# Altium schematic symbol library Connector.SchLib: 394 symbols (part 2 of 4) (continued)
## Conn_01x55_Pin
designator *  value Conn_01x55_Pin  Reference: J
"Generic connector, single row, 01x55, script generated"; ki_fp_filters: Connector*:*_1x??_*; Datasheet: ~; Description_: "Generic connector, single row, 01x55, script generated"; ki_keywords: connector
pins: 1 Pin_1, 2 Pin_2, 3 Pin_3, 4 Pin_4, 5 Pin_5, 6 Pin_6, 7 Pin_7, 8 Pin_8, 9 Pin_9, 10 Pin_10, 11 Pin_11, 12 Pin_12, 13 Pin_13, 14 Pin_14, 15 Pin_15, 16 Pin_16, 17 Pin_17, 18 Pin_18, 19 Pin_19, 20 Pin_20, 21 Pin_21, 22 Pin_22, 23 Pin_23, 24 Pin_24, 25 Pin_25, 26 Pin_26, 27 Pin_27, 28 Pin_28, 29 Pin_29, 30 Pin_30, 31 Pin_31, 32 Pin_32, 33 Pin_33, 34 Pin_34, 35 Pin_35, 36 Pin_36, 37 Pin_37, 38 Pin_38, 39 Pin_39, 40 Pin_40, 41 Pin_41, 42 Pin_42, 43 Pin_43, 44 Pin_44, 45 Pin_45, 46 Pin_46, 47 Pin_47, 48 Pin_48, 49 Pin_49, 50 Pin_50, 51 Pin_51, 52 Pin_52, 53 Pin_53, 54 Pin_54, 55 Pin_55

## Conn_01x55_Socket
designator *  value Conn_01x55_Socket  Reference: J
"Generic connector, single row, 01x55, script generated"; ki_fp_filters: Connector*:*_1x??_*; Datasheet: ~; Description_: "Generic connector, single row, 01x55, script generated"; ki_keywords: connector
pins: 1 Pin_1, 2 Pin_2, 3 Pin_3, 4 Pin_4, 5 Pin_5, 6 Pin_6, 7 Pin_7, 8 Pin_8, 9 Pin_9, 10 Pin_10, 11 Pin_11, 12 Pin_12, 13 Pin_13, 14 Pin_14, 15 Pin_15, 16 Pin_16, 17 Pin_17, 18 Pin_18, 19 Pin_19, 20 Pin_20, 21 Pin_21, 22 Pin_22, 23 Pin_23, 24 Pin_24, 25 Pin_25, 26 Pin_26, 27 Pin_27, 28 Pin_28, 29 Pin_29, 30 Pin_30, 31 Pin_31, 32 Pin_32, 33 Pin_33, 34 Pin_34, 35 Pin_35, 36 Pin_36, 37 Pin_37, 38 Pin_38, 39 Pin_39, 40 Pin_40, 41 Pin_41, 42 Pin_42, 43 Pin_43, 44 Pin_44, 45 Pin_45, 46 Pin_46, 47 Pin_47, 48 Pin_48, 49 Pin_49, 50 Pin_50, 51 Pin_51, 52 Pin_52, 53 Pin_53, 54 Pin_54, 55 Pin_55

## Conn_01x56_Pin
designator *  value Conn_01x56_Pin  Reference: J
"Generic connector, single row, 01x56, script generated"; ki_fp_filters: Connector*:*_1x??_*; Datasheet: ~; Description_: "Generic connector, single row, 01x56, script generated"; ki_keywords: connector
pins: 1 Pin_1, 2 Pin_2, 3 Pin_3, 4 Pin_4, 5 Pin_5, 6 Pin_6, 7 Pin_7, 8 Pin_8, 9 Pin_9, 10 Pin_10, 11 Pin_11, 12 Pin_12, 13 Pin_13, 14 Pin_14, 15 Pin_15, 16 Pin_16, 17 Pin_17, 18 Pin_18, 19 Pin_19, 20 Pin_20, 21 Pin_21, 22 Pin_22, 23 Pin_23, 24 Pin_24, 25 Pin_25, 26 Pin_26, 27 Pin_27, 28 Pin_28, 29 Pin_29, 30 Pin_30, 31 Pin_31, 32 Pin_32, 33 Pin_33, 34 Pin_34, 35 Pin_35, 36 Pin_36, 37 Pin_37, 38 Pin_38, 39 Pin_39, 40 Pin_40, 41 Pin_41, 42 Pin_42, 43 Pin_43, 44 Pin_44, 45 Pin_45, 46 Pin_46, 47 Pin_47, 48 Pin_48, 49 Pin_49, 50 Pin_50, 51 Pin_51, 52 Pin_52, 53 Pin_53, 54 Pin_54, 55 Pin_55, 56 Pin_56

## Conn_01x56_Socket
designator *  value Conn_01x56_Socket  Reference: J
"Generic connector, single row, 01x56, script generated"; ki_fp_filters: Connector*:*_1x??_*; Datasheet: ~; Description_: "Generic connector, single row, 01x56, script generated"; ki_keywords: connector
pins: 1 Pin_1, 2 Pin_2, 3 Pin_3, 4 Pin_4, 5 Pin_5, 6 Pin_6, 7 Pin_7, 8 Pin_8, 9 Pin_9, 10 Pin_10, 11 Pin_11, 12 Pin_12, 13 Pin_13, 14 Pin_14, 15 Pin_15, 16 Pin_16, 17 Pin_17, 18 Pin_18, 19 Pin_19, 20 Pin_20, 21 Pin_21, 22 Pin_22, 23 Pin_23, 24 Pin_24, 25 Pin_25, 26 Pin_26, 27 Pin_27, 28 Pin_28, 29 Pin_29, 30 Pin_30, 31 Pin_31, 32 Pin_32, 33 Pin_33, 34 Pin_34, 35 Pin_35, 36 Pin_36, 37 Pin_37, 38 Pin_38, 39 Pin_39, 40 Pin_40, 41 Pin_41, 42 Pin_42, 43 Pin_43, 44 Pin_44, 45 Pin_45, 46 Pin_46, 47 Pin_47, 48 Pin_48, 49 Pin_49, 50 Pin_50, 51 Pin_51, 52 Pin_52, 53 Pin_53, 54 Pin_54, 55 Pin_55, 56 Pin_56

## Conn_01x57_Pin
designator *  value Conn_01x57_Pin  Reference: J
"Generic connector, single row, 01x57, script generated"; ki_fp_filters: Connector*:*_1x??_*; Datasheet: ~; Description_: "Generic connector, single row, 01x57, script generated"; ki_keywords: connector
pins: 1 Pin_1, 2 Pin_2, 3 Pin_3, 4 Pin_4, 5 Pin_5, 6 Pin_6, 7 Pin_7, 8 Pin_8, 9 Pin_9, 10 Pin_10, 11 Pin_11, 12 Pin_12, 13 Pin_13, 14 Pin_14, 15 Pin_15, 16 Pin_16, 17 Pin_17, 18 Pin_18, 19 Pin_19, 20 Pin_20, 21 Pin_21, 22 Pin_22, 23 Pin_23, 24 Pin_24, 25 Pin_25, 26 Pin_26, 27 Pin_27, 28 Pin_28, 29 Pin_29, 30 Pin_30, 31 Pin_31, 32 Pin_32, 33 Pin_33, 34 Pin_34, 35 Pin_35, 36 Pin_36, 37 Pin_37, 38 Pin_38, 39 Pin_39, 40 Pin_40, 41 Pin_41, 42 Pin_42, 43 Pin_43, 44 Pin_44, 45 Pin_45, 46 Pin_46, 47 Pin_47, 48 Pin_48, 49 Pin_49, 50 Pin_50, 51 Pin_51, 52 Pin_52, 53 Pin_53, 54 Pin_54, 55 Pin_55, 56 Pin_56, 57 Pin_57

## Conn_01x57_Socket
designator *  value Conn_01x57_Socket  Reference: J
"Generic connector, single row, 01x57, script generated"; ki_fp_filters: Connector*:*_1x??_*; Datasheet: ~; Description_: "Generic connector, single row, 01x57, script generated"; ki_keywords: connector
pins: 1 Pin_1, 2 Pin_2, 3 Pin_3, 4 Pin_4, 5 Pin_5, 6 Pin_6, 7 Pin_7, 8 Pin_8, 9 Pin_9, 10 Pin_10, 11 Pin_11, 12 Pin_12, 13 Pin_13, 14 Pin_14, 15 Pin_15, 16 Pin_16, 17 Pin_17, 18 Pin_18, 19 Pin_19, 20 Pin_20, 21 Pin_21, 22 Pin_22, 23 Pin_23, 24 Pin_24, 25 Pin_25, 26 Pin_26, 27 Pin_27, 28 Pin_28, 29 Pin_29, 30 Pin_30, 31 Pin_31, 32 Pin_32, 33 Pin_33, 34 Pin_34, 35 Pin_35, 36 Pin_36, 37 Pin_37, 38 Pin_38, 39 Pin_39, 40 Pin_40, 41 Pin_41, 42 Pin_42, 43 Pin_43, 44 Pin_44, 45 Pin_45, 46 Pin_46, 47 Pin_47, 48 Pin_48, 49 Pin_49, 50 Pin_50, 51 Pin_51, 52 Pin_52, 53 Pin_53, 54 Pin_54, 55 Pin_55, 56 Pin_56, 57 Pin_57

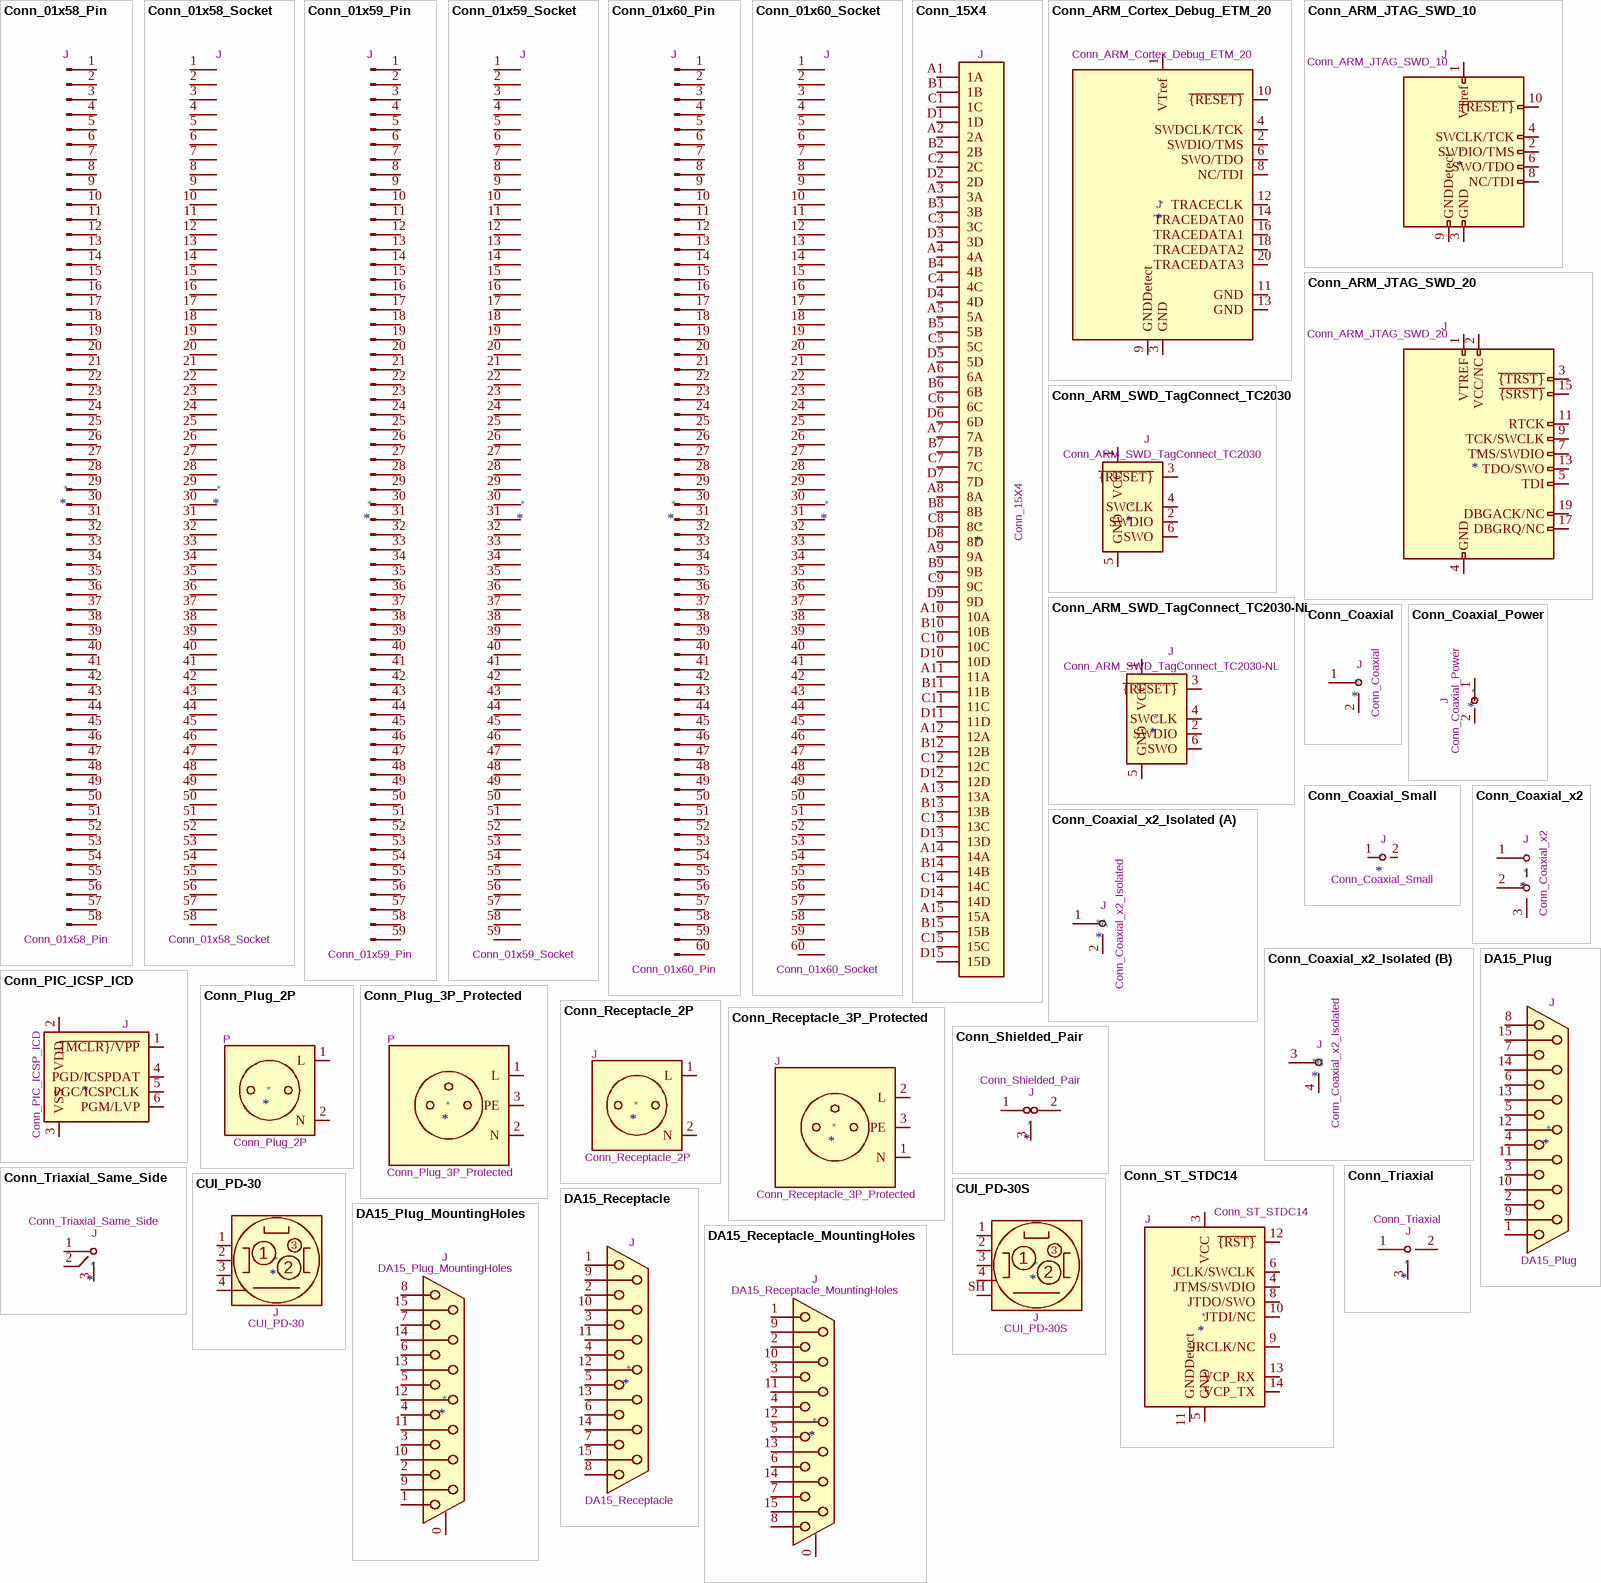
[diagram p8: symbols Conn_01x58_Pin to DA15_Receptacle_MountingHoles]

## Conn_01x58_Pin
designator *  value Conn_01x58_Pin  Reference: J
"Generic connector, single row, 01x58, script generated"; ki_fp_filters: Connector*:*_1x??_*; Datasheet: ~; Description_: "Generic connector, single row, 01x58, script generated"; ki_keywords: connector
pins: 1 Pin_1, 2 Pin_2, 3 Pin_3, 4 Pin_4, 5 Pin_5, 6 Pin_6, 7 Pin_7, 8 Pin_8, 9 Pin_9, 10 Pin_10, 11 Pin_11, 12 Pin_12, 13 Pin_13, 14 Pin_14, 15 Pin_15, 16 Pin_16, 17 Pin_17, 18 Pin_18, 19 Pin_19, 20 Pin_20, 21 Pin_21, 22 Pin_22, 23 Pin_23, 24 Pin_24, 25 Pin_25, 26 Pin_26, 27 Pin_27, 28 Pin_28, 29 Pin_29, 30 Pin_30, 31 Pin_31, 32 Pin_32, 33 Pin_33, 34 Pin_34, 35 Pin_35, 36 Pin_36, 37 Pin_37, 38 Pin_38, 39 Pin_39, 40 Pin_40, 41 Pin_41, 42 Pin_42, 43 Pin_43, 44 Pin_44, 45 Pin_45, 46 Pin_46, 47 Pin_47, 48 Pin_48, 49 Pin_49, 50 Pin_50, 51 Pin_51, 52 Pin_52, 53 Pin_53, 54 Pin_54, 55 Pin_55, 56 Pin_56, 57 Pin_57, 58 Pin_58

## Conn_01x58_Socket
designator *  value Conn_01x58_Socket  Reference: J
"Generic connector, single row, 01x58, script generated"; ki_fp_filters: Connector*:*_1x??_*; Datasheet: ~; Description_: "Generic connector, single row, 01x58, script generated"; ki_keywords: connector
pins: 1 Pin_1, 2 Pin_2, 3 Pin_3, 4 Pin_4, 5 Pin_5, 6 Pin_6, 7 Pin_7, 8 Pin_8, 9 Pin_9, 10 Pin_10, 11 Pin_11, 12 Pin_12, 13 Pin_13, 14 Pin_14, 15 Pin_15, 16 Pin_16, 17 Pin_17, 18 Pin_18, 19 Pin_19, 20 Pin_20, 21 Pin_21, 22 Pin_22, 23 Pin_23, 24 Pin_24, 25 Pin_25, 26 Pin_26, 27 Pin_27, 28 Pin_28, 29 Pin_29, 30 Pin_30, 31 Pin_31, 32 Pin_32, 33 Pin_33, 34 Pin_34, 35 Pin_35, 36 Pin_36, 37 Pin_37, 38 Pin_38, 39 Pin_39, 40 Pin_40, 41 Pin_41, 42 Pin_42, 43 Pin_43, 44 Pin_44, 45 Pin_45, 46 Pin_46, 47 Pin_47, 48 Pin_48, 49 Pin_49, 50 Pin_50, 51 Pin_51, 52 Pin_52, 53 Pin_53, 54 Pin_54, 55 Pin_55, 56 Pin_56, 57 Pin_57, 58 Pin_58

## Conn_01x59_Pin
designator *  value Conn_01x59_Pin  Reference: J
"Generic connector, single row, 01x59, script generated"; ki_fp_filters: Connector*:*_1x??_*; Datasheet: ~; Description_: "Generic connector, single row, 01x59, script generated"; ki_keywords: connector
pins: 1 Pin_1, 2 Pin_2, 3 Pin_3, 4 Pin_4, 5 Pin_5, 6 Pin_6, 7 Pin_7, 8 Pin_8, 9 Pin_9, 10 Pin_10, 11 Pin_11, 12 Pin_12, 13 Pin_13, 14 Pin_14, 15 Pin_15, 16 Pin_16, 17 Pin_17, 18 Pin_18, 19 Pin_19, 20 Pin_20, 21 Pin_21, 22 Pin_22, 23 Pin_23, 24 Pin_24, 25 Pin_25, 26 Pin_26, 27 Pin_27, 28 Pin_28, 29 Pin_29, 30 Pin_30, 31 Pin_31, 32 Pin_32, 33 Pin_33, 34 Pin_34, 35 Pin_35, 36 Pin_36, 37 Pin_37, 38 Pin_38, 39 Pin_39, 40 Pin_40, 41 Pin_41, 42 Pin_42, 43 Pin_43, 44 Pin_44, 45 Pin_45, 46 Pin_46, 47 Pin_47, 48 Pin_48, 49 Pin_49, 50 Pin_50, 51 Pin_51, 52 Pin_52, 53 Pin_53, 54 Pin_54, 55 Pin_55, 56 Pin_56, 57 Pin_57, 58 Pin_58, 59 Pin_59

## Conn_01x59_Socket
designator *  value Conn_01x59_Socket  Reference: J
"Generic connector, single row, 01x59, script generated"; ki_fp_filters: Connector*:*_1x??_*; Datasheet: ~; Description_: "Generic connector, single row, 01x59, script generated"; ki_keywords: connector
pins: 1 Pin_1, 2 Pin_2, 3 Pin_3, 4 Pin_4, 5 Pin_5, 6 Pin_6, 7 Pin_7, 8 Pin_8, 9 Pin_9, 10 Pin_10, 11 Pin_11, 12 Pin_12, 13 Pin_13, 14 Pin_14, 15 Pin_15, 16 Pin_16, 17 Pin_17, 18 Pin_18, 19 Pin_19, 20 Pin_20, 21 Pin_21, 22 Pin_22, 23 Pin_23, 24 Pin_24, 25 Pin_25, 26 Pin_26, 27 Pin_27, 28 Pin_28, 29 Pin_29, 30 Pin_30, 31 Pin_31, 32 Pin_32, 33 Pin_33, 34 Pin_34, 35 Pin_35, 36 Pin_36, 37 Pin_37, 38 Pin_38, 39 Pin_39, 40 Pin_40, 41 Pin_41, 42 Pin_42, 43 Pin_43, 44 Pin_44, 45 Pin_45, 46 Pin_46, 47 Pin_47, 48 Pin_48, 49 Pin_49, 50 Pin_50, 51 Pin_51, 52 Pin_52, 53 Pin_53, 54 Pin_54, 55 Pin_55, 56 Pin_56, 57 Pin_57, 58 Pin_58, 59 Pin_59

## Conn_01x60_Pin
designator *  value Conn_01x60_Pin  Reference: J
"Generic connector, single row, 01x60, script generated"; ki_fp_filters: Connector*:*_1x??_*; Datasheet: ~; Description_: "Generic connector, single row, 01x60, script generated"; ki_keywords: connector
pins: 1 Pin_1, 2 Pin_2, 3 Pin_3, 4 Pin_4, 5 Pin_5, 6 Pin_6, 7 Pin_7, 8 Pin_8, 9 Pin_9, 10 Pin_10, 11 Pin_11, 12 Pin_12, 13 Pin_13, 14 Pin_14, 15 Pin_15, 16 Pin_16, 17 Pin_17, 18 Pin_18, 19 Pin_19, 20 Pin_20, 21 Pin_21, 22 Pin_22, 23 Pin_23, 24 Pin_24, 25 Pin_25, 26 Pin_26, 27 Pin_27, 28 Pin_28, 29 Pin_29, 30 Pin_30, 31 Pin_31, 32 Pin_32, 33 Pin_33, 34 Pin_34, 35 Pin_35, 36 Pin_36, 37 Pin_37, 38 Pin_38, 39 Pin_39, 40 Pin_40, 41 Pin_41, 42 Pin_42, 43 Pin_43, 44 Pin_44, 45 Pin_45, 46 Pin_46, 47 Pin_47, 48 Pin_48, 49 Pin_49, 50 Pin_50, 51 Pin_51, 52 Pin_52, 53 Pin_53, 54 Pin_54, 55 Pin_55, 56 Pin_56, 57 Pin_57, 58 Pin_58, 59 Pin_59, 60 Pin_60

## Conn_01x60_Socket
designator *  value Conn_01x60_Socket  Reference: J
"Generic connector, single row, 01x60, script generated"; ki_fp_filters: Connector*:*_1x??_*; Datasheet: ~; Description_: "Generic connector, single row, 01x60, script generated"; ki_keywords: connector
pins: 1 Pin_1, 2 Pin_2, 3 Pin_3, 4 Pin_4, 5 Pin_5, 6 Pin_6, 7 Pin_7, 8 Pin_8, 9 Pin_9, 10 Pin_10, 11 Pin_11, 12 Pin_12, 13 Pin_13, 14 Pin_14, 15 Pin_15, 16 Pin_16, 17 Pin_17, 18 Pin_18, 19 Pin_19, 20 Pin_20, 21 Pin_21, 22 Pin_22, 23 Pin_23, 24 Pin_24, 25 Pin_25, 26 Pin_26, 27 Pin_27, 28 Pin_28, 29 Pin_29, 30 Pin_30, 31 Pin_31, 32 Pin_32, 33 Pin_33, 34 Pin_34, 35 Pin_35, 36 Pin_36, 37 Pin_37, 38 Pin_38, 39 Pin_39, 40 Pin_40, 41 Pin_41, 42 Pin_42, 43 Pin_43, 44 Pin_44, 45 Pin_45, 46 Pin_46, 47 Pin_47, 48 Pin_48, 49 Pin_49, 50 Pin_50, 51 Pin_51, 52 Pin_52, 53 Pin_53, 54 Pin_54, 55 Pin_55, 56 Pin_56, 57 Pin_57, 58 Pin_58, 59 Pin_59, 60 Pin_60

## Conn_15X4
designator *  value Conn_15X4  Reference: J
Connector Europe, 60 contacts, ranges A,B,C,D; Datasheet: ~; Description_: Connector Europe, 60 contacts, ranges A,B,C,D; ki_keywords: connector
pins: A1 1A, A2 2A, A3 3A, A4 4A, A5 5A, A6 6A, A7 7A, A8 8A, A9 9A, A10 10A, A11 11A, A12 12A, A13 13A, A14 14A, A15 15A, B1 1B, B2 2B, B3 3B, B4 4B, B5 5B, B6 6B, B7 7B, B8 8B, B9 9B, B10 10B, B11 11B, B12 12B, B13 13B, B14 14B, B15 15B, C1 1C, C2 2C, C3 3C, C4 4C, C5 5C, C6 6C, C7 7C, C8 8C, C9 9C, C10 10C, C11 11C, C12 12C, C13 13C, C14 14C, C15 15C, D1 1D, D2 2D, D3 3D, D4 4D, D5 5D, D6 6D, D7 7D, D8 8D, D9 9D, D10 10D, D11 11D, D12 12D, D13 13D, D14 14D, D15 15D

## Conn_ARM_Cortex_Debug_ETM_20
designator *  value Conn_ARM_Cortex_Debug_ETM_20  Reference: J
Arm Cortex Debug+ETM Connector; ki_keywords: Trace; ki_fp_filters: PinHeader?2x10?P1.27mm*; Datasheet: http://infocenter.arm.com/help/topic/com.arm.doc.ddi0314h/DDI0314H_coresight_components_trm.pdf; Description_: Arm Cortex Debug+ETM Connector
pins: 1 VTref, 2 SWDIO/TMS, 3 GND, 4 SWDCLK/TCK, 5 GND hidden, 6 SWO/TDO, 7 KEY hidden, 8 NC/TDI, 9 GNDDetect, 10 ~{{RESET}}, 11 GND, 12 TRACECLK, 13 GND, 14 TRACEDATA0, 15 GND hidden, 16 TRACEDATA1, 17 GND hidden, 18 TRACEDATA2, 19 GND hidden, 20 TRACEDATA3

## Conn_ARM_JTAG_SWD_10
designator *  value Conn_ARM_JTAG_SWD_10  Reference: J
Cortex Debug Connector, standard ARM Cortex-M SWD and JTAG interface; ki_keywords: Cortex Debug Connector ARM SWD JTAG; ki_fp_filters: PinHeader?2x05?P1.27mm*; Datasheet: http://infocenter.arm.com/help/topic/com.arm.doc.ddi0314h/DDI0314H_coresight_components_trm.pdf; Description_: Cortex Debug Connector, standard ARM Cortex-M SWD and JTAG interface
pins: 1 VTref, 2 SWDIO/TMS, 3 GND, 4 SWCLK/TCK, 5 GND hidden, 6 SWO/TDO, 7 KEY hidden, 8 NC/TDI, 9 GNDDetect, 10 ~{{RESET}}

## Conn_ARM_JTAG_SWD_20
designator *  value Conn_ARM_JTAG_SWD_20  Reference: J
Standard IDC20 Pinheader Connector, ARM legacy JTAG and SWD interface; ki_keywords: IDC20 Pinheader Pins Connector ARM JTAG SWD; ki_fp_filters: IDC*Header*P2.54mm* PinHeader*2x10*P2.54mm*; Datasheet: http://infocenter.arm.com/help/topic/com.arm.doc.dui0499b/DUI0499B_system_design_reference.pdf; Description_: Standard IDC20 Pinheader Connector, ARM legacy JTAG and SWD interface
pins: 1 VTREF, 2 VCC/NC, 3 ~{{TRST}}, 4 GND, 5 TDI, 6 GND hidden, 7 TMS/SWDIO, 8 GND hidden, 9 TCK/SWCLK, 10 GND hidden, 11 RTCK, 12 GND hidden, 13 TDO/SWO, 14 GND hidden, 15 ~{{SRST}}, 16 GND hidden, 17 DBGRQ/NC, 18 GND hidden, 19 DBGACK/NC, 20 GND hidden

## Conn_ARM_SWD_TagConnect_TC2030
designator *  value Conn_ARM_SWD_TagConnect_TC2030  Reference: J
Tag-Connect ARM Cortex SWD JTAG connector, 6 pin; ki_keywords: Cortex Debug Connector ARM SWD JTAG; ki_fp_filters: *TC2030*; Footprint: Connector:Tag-Connect_TC2030-IDC-FP_2x03_P1.27mm_Vertical; Datasheet: https://www.tag-connect.com/wp-content/uploads/bsk-pdf-manager/TC2030-CTX_1.pdf; Description_: Tag-Connect ARM Cortex SWD JTAG connector, 6 pin
pins: 1 VCC, 2 SWDIO, 3 ~{{RESET}}, 4 SWCLK, 5 GND, 6 SWO

## Conn_ARM_SWD_TagConnect_TC2030-NL
designator *  value Conn_ARM_SWD_TagConnect_TC2030-NL  Reference: J
Tag-Connect ARM Cortex SWD JTAG connector, 6 pin, no legs; ki_keywords: Cortex Debug Connector ARM SWD JTAG; ki_fp_filters: *TC2030*; Footprint: Connector:Tag-Connect_TC2030-IDC-NL_2x03_P1.27mm_Vertical; Datasheet: https://www.tag-connect.com/wp-content/uploads/bsk-pdf-manager/TC2030-CTX_1.pdf; Description_: Tag-Connect ARM Cortex SWD JTAG connector, 6 pin, no legs
pins: 1 VCC, 2 SWDIO, 3 ~{{RESET}}, 4 SWCLK, 5 GND, 6 SWO

## Conn_Coaxial
designator *  value Conn_Coaxial  Reference: J
coaxial connector (BNC, SMA, SMB, SMC, Cinch/RCA, LEMO, ...); ki_keywords: BNC SMA SMB SMC LEMO coaxial connector CINCH RCA MCX MMCX U.FL UMRF; ki_fp_filters: *BNC* *SMA* *SMB* *SMC* *Cinch* *LEMO* *UMRF* *MCX* *U.FL*; Datasheet: ~; Description_: coaxial connector (BNC, SMA, SMB, SMC, Cinch/RCA, LEMO, ...)
pins: 1 In, 2 Ext

## Conn_Coaxial_Power
designator *  value Conn_Coaxial_Power  Reference: J
coaxial connector (BNC, SMA, SMB, SMC, Cinch/RCA, LEMO, ...); ki_keywords: BNC SMA SMB SMC LEMO coaxial connector CINCH RCA; ki_fp_filters: *BNC* *SMA* *SMB* *SMC* *Cinch* *LEMO*; Datasheet: ~; Description_: coaxial connector (BNC, SMA, SMB, SMC, Cinch/RCA, LEMO, ...)
pins: 1 In, 2 Ext

## Conn_Coaxial_Small
designator *  value Conn_Coaxial_Small  Reference: J
small coaxial connector (BNC, SMA, SMB, SMC, Cinch/RCA, LEMO, ...); ki_keywords: BNC SMA SMB SMC LEMO coaxial connector CINCH RCA MCX MMCX U.FL UMRF; ki_fp_filters: *BNC* *SMA* *SMB* *SMC* *Cinch* *LEMO* *UMRF* *MCX* *U.FL*; Datasheet: ~; Description_: small coaxial connector (BNC, SMA, SMB, SMC, Cinch/RCA, LEMO, ...)
pins: 1 In, 2 Ext

## Conn_Coaxial_x2
designator *  value Conn_Coaxial_x2  Reference: J
double coaxial connector (BNC, SMA, SMB, SMC, Cinch/RCA, LEMO, ...); ki_keywords: BNC SMA SMB SMC LEMO coaxial connector CINCH RCA; ki_fp_filters: *BNC* *SMA* *SMB* *SMC* *Cinch* *LEMO*; Datasheet: ~; Description_: double coaxial connector (BNC, SMA, SMB, SMC, Cinch/RCA, LEMO, ...)
pins: 1 IN1, 2 IN2, 3 EXT

## Conn_Coaxial_x2_Isolated
designator *  value Conn_Coaxial_x2_Isolated  Reference: J
coaxial connector (BNC, SMA, SMB, SMC, Cinch/RCA, LEMO, ...); ki_keywords: BNC SMA SMB SMC LEMO coaxial connector CINCH RCA; ki_fp_filters: *BNC* *SMA* *SMB* *SMC* *Cinch* *LEMO*; Datasheet: ~; Description_: coaxial connector (BNC, SMA, SMB, SMC, Cinch/RCA, LEMO, ...)
part A pins: 1 In1, 2 Ext1
part B pins: 3 In2, 4 Ext2

## Conn_PIC_ICSP_ICD
designator *  value Conn_PIC_ICSP_ICD  Reference: J
Microchip PIC In-Circuit Serial Programming/Debugging (ICSP/ICD) connector; ki_keywords: icsp icd pic microchip; ki_fp_filters: PinHeader*1x06*P2.54mm* PinSocket*1x06*P2.54mm*; Datasheet: http://ww1.microchip.com/downloads/en/devicedoc/30277d.pdf; Description_: Microchip PIC In-Circuit Serial Programming/Debugging (ICSP/ICD) connector
pins: 1 ~{{MCLR}/VPP}, 2 VDD, 3 VSS, 4 PGD/ICSPDAT, 5 PGC/ICSPCLK, 6 PGM/LVP

## Conn_Plug_2P
designator *  value Conn_Plug_2P  Reference: P
2 Pins non-protected generic plug; ki_keywords: 2P mains plug wall; ki_fp_filters: CEE*7/2* CEE*7/16* CEE*7/17* NEMA*1?15* SN?441011*Type?11*; Datasheet: ~; Description_: 2 Pins non-protected generic plug
pins: 1 L, 2 N

## Conn_Plug_3P_Protected
designator *  value Conn_Plug_3P_Protected  Reference: P
3 Pins protected generic plug; ki_keywords: 3P mains plug protected wall; ki_fp_filters: CEE*7/2* CEE*7/16* CEE*7/17* NEMA*1?15* SN?441011?Type*11*; Datasheet: ~; Description_: 3 Pins protected generic plug
pins: 1 L, 2 N, 3 PE

## Conn_Receptacle_2P
designator *  value Conn_Receptacle_2P  Reference: J
2 Pins non-protected generic plug; ki_keywords: 2P mains receptacle wall; ki_fp_filters: CEE*7/2* CEE*7/16* CEE*7/17* NEMA*1?15* SN?441011*Type?11*; Datasheet: ~; Description_: 2 Pins non-protected generic plug
pins: 1 L, 2 N

## Conn_Receptacle_3P_Protected
designator *  value Conn_Receptacle_3P_Protected  Reference: J
3 Pins protected generic receptacle; ki_keywords: 3P mains receptacle protected wall; ki_fp_filters: CEE*7/2* CEE*7/16* CEE*7/17* NEMA*1?15* SN?441011?Type*11*; Datasheet: ~; Description_: 3 Pins protected generic receptacle
pins: 1 N, 2 L, 3 PE

## Conn_Shielded_Pair
designator *  value Conn_Shielded_Pair  Reference: J
triaxial connector (LEMO 00.302, ...); ki_keywords: LEMO triaxial connector differential LVDS Conn_Triaxial; ki_fp_filters: *LEMO*; Datasheet: ~; Description_: triaxial connector (LEMO 00.302, ...)
pins: 1 In1, 2 In2, 3 Ext

## Conn_ST_STDC14
designator *  value Conn_ST_STDC14  Reference: J
ST Debug Connector, standard ARM Cortex-M SWD and JTAG interface plus UART; ki_keywords: ST STM32 Cortex Debug Connector ARM SWD JTAG; ki_fp_filters: PinHeader?2x07?P1.27mm*; Datasheet: https://www.st.com/content/ccc/resource/technical/document/user_manual/group1/99/49/91/b6/b2/3a/46/e5/DM00526767/files/DM00526767.pdf/jcr:content/translations/en.DM00526767.pdf; Description_: ST Debug Connector, standard ARM Cortex-M SWD and JTAG interface plus UART
pins: 1 NC hidden, 2 NC hidden, 3 VCC, 4 JTMS/SWDIO, 5 GND, 6 JCLK/SWCLK, 7 GND hidden, 8 JTDO/SWO, 9 JRCLK/NC, 10 JTDI/NC, 11 GNDDetect, 12 ~{{RST}}, 13 VCP_RX, 14 VCP_TX

## Conn_Triaxial
designator *  value Conn_Triaxial  Reference: J
triaxial connector (LEMO 00.302, ...); ki_keywords: LEMO triaxial connector differential LVDS; ki_fp_filters: *LEMO*; Datasheet: ~; Description_: triaxial connector (LEMO 00.302, ...)
pins: 1 In1, 2 In2, 3 Ext

## Conn_Triaxial_Same_Side
designator *  value Conn_Triaxial_Same_Side  Reference: J
triaxial connector (LEMO 00.302, ...); ki_keywords: LEMO triaxial connector differential LVDS; ki_fp_filters: *LEMO*; Datasheet: ~; Description_: triaxial connector (LEMO 00.302, ...)
pins: 1 In1, 2 In2, 3 Ext

## CUI_PD-30
designator *  value CUI_PD-30  Reference: J
3 pin connector, PD-30; ki_keywords: connector 3-pin PD-30 power DIN; ki_fp_filters: CUI*PD*30*; Footprint: Connector:CUI_PD-30; Datasheet: http://www.cui.com/product/resource/pd-30.pdf; Description_: 3 pin connector, PD-30
pins: 1, 2, 3, 4 Shield

## CUI_PD-30S
designator *  value CUI_PD-30S  Reference: J
3 pin connector, PD-30S; ki_keywords: connector 3-pin PD-30S power DIN; ki_fp_filters: CUI*PD*30S*; Footprint: Connector:CUI_PD-30S; Datasheet: http://www.cui.com/product/resource/pd-30.pdf; Description_: 3 pin connector, PD-30S
pins: 1, 2, 3, 4 Shield, SH Shield

## DA15_Plug
designator *  value DA15_Plug  Reference: J
15-pin male plug pin D-SUB connector (low-density/2 columns); ki_keywords: male plug D-SUB connector; ki_fp_filters: DSUB*Male*; Datasheet: ~; Description_: 15-pin male plug pin D-SUB connector (low-density/2 columns)
pins: 1, 2, 3, 4, 5, 6, 7, 8, 9 P9, 10 P10, 11 P111, 12 P12, 13 P13, 14 P14, 15 P15

## DA15_Plug_MountingHoles
designator *  value DA15_Plug_MountingHoles  Reference: J
15-pin male plug pin D-SUB connector (low-density/2 columns), Mounting Hole; ki_keywords: male plug D-SUB connector; ki_fp_filters: DSUB*Male*; Datasheet: ~; Description_: 15-pin male plug pin D-SUB connector (low-density/2 columns), Mounting Hole
pins: 0 PAD, 1, 2, 3, 4, 5, 6, 7, 8, 9 P9, 10 P10, 11 P111, 12 P12, 13 P13, 14 P14, 15 P15

## DA15_Receptacle
designator *  value DA15_Receptacle  Reference: J
15-pin female receptacle socket D-SUB connector (low-density/2 columns); ki_keywords: female receptacle D-SUB connector; ki_fp_filters: DSUB*Female*; Datasheet: ~; Description_: 15-pin female receptacle socket D-SUB connector (low-density/2 columns)
pins: 1, 2, 3, 4, 5, 6, 7, 8, 9 P9, 10 P10, 11 P111, 12 P12, 13 P13, 14 P14, 15 P15

## DA15_Receptacle_MountingHoles
designator *  value DA15_Receptacle_MountingHoles  Reference: J
15-pin female receptacle socket D-SUB connector (low-density/2 columns), Mounting Hole; ki_keywords: female receptacle D-SUB connector; ki_fp_filters: DSUB*Female*; Datasheet: ~; Description_: 15-pin female receptacle socket D-SUB connector (low-density/2 columns), Mounting Hole
pins: 0 PAD, 1, 2, 3, 4, 5, 6, 7, 8, 9 P9, 10 P10, 11 P111, 12 P12, 13 P13, 14 P14, 15 P15

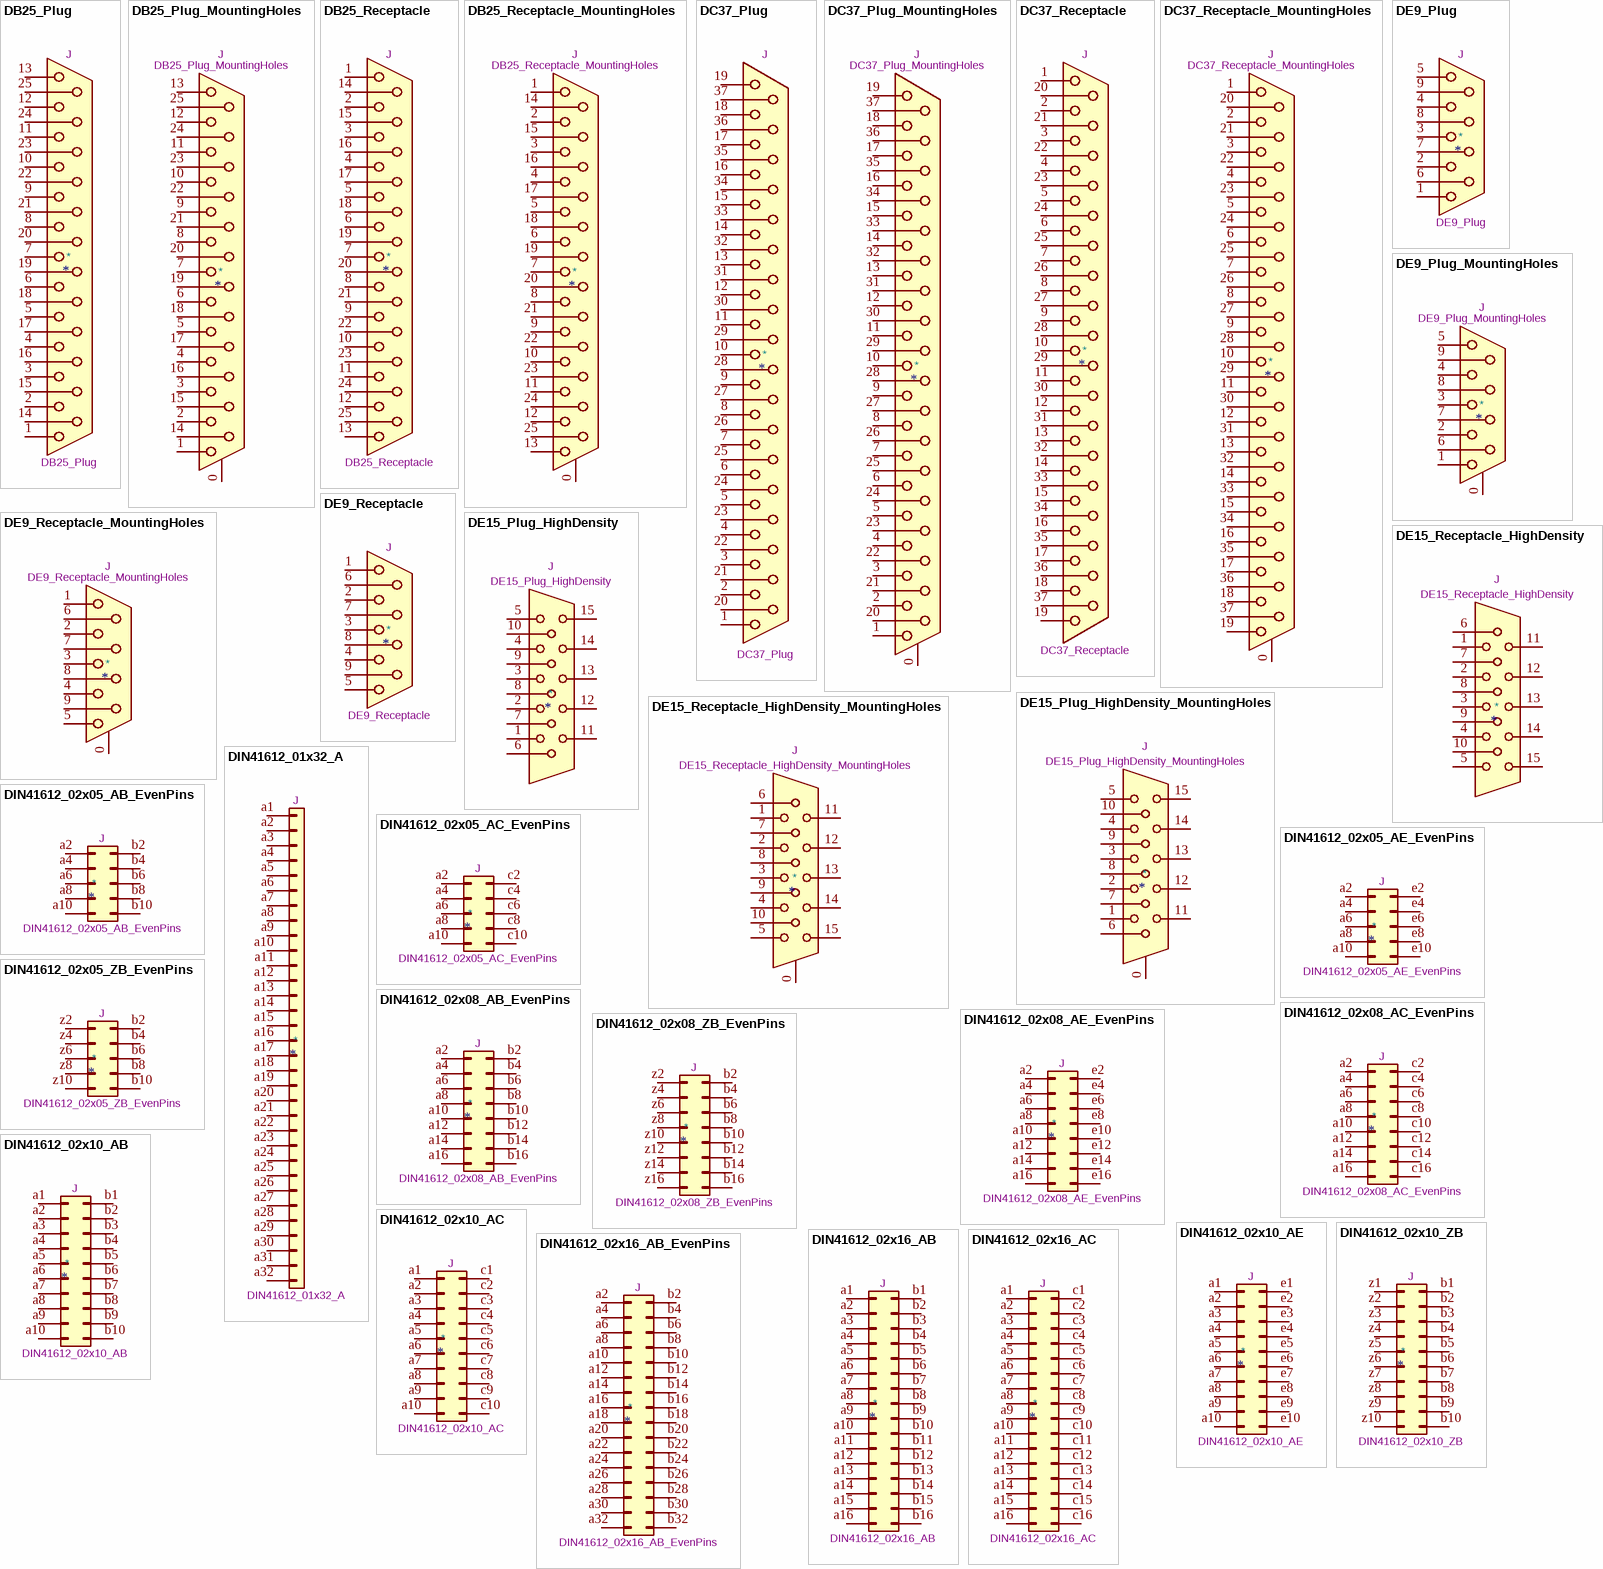
[diagram p9: symbols DB25_Plug to DIN41612_02x16_AC]

## DB25_Plug
designator *  value DB25_Plug  Reference: J
25-pin male plug pin D-SUB connector; ki_keywords: male plug D-SUB connector; ki_fp_filters: DSUB*Male*; Datasheet: ~; Description_: 25-pin male plug pin D-SUB connector
pins: 1, 2, 3, 4, 5, 6, 7, 8, 9, 10, 11, 12, 13, 14 P14, 15 P15, 16 P16, 17 P17, 18 P18, 19 P19, 20 P20, 21 P21, 22 P22, 23 P23, 24 P24, 25 P25

## DB25_Plug_MountingHoles
designator *  value DB25_Plug_MountingHoles  Reference: J
25-pin male plug pin D-SUB connector, Mounting Hole; ki_keywords: male plug D-SUB connector; ki_fp_filters: DSUB*Male*; Datasheet: ~; Description_: 25-pin male plug pin D-SUB connector, Mounting Hole
pins: 0 PAD, 1, 2, 3, 4, 5, 6, 7, 8, 9, 10, 11, 12, 13, 14 P14, 15 P15, 16 P16, 17 P17, 18 P18, 19 P19, 20 P20, 21 P21, 22 P22, 23 P23, 24 P24, 25 P25

## DB25_Receptacle
designator *  value DB25_Receptacle  Reference: J
25-pin female receptacle socket D-SUB connector; ki_keywords: female receptacle D-SUB connector; ki_fp_filters: DSUB*Female*; Datasheet: ~; Description_: 25-pin female receptacle socket D-SUB connector
pins: 1, 2, 3, 4, 5, 6, 7, 8, 9, 10, 11, 12, 13, 14 P14, 15 P15, 16 P16, 17 P17, 18 P18, 19 P19, 20 P20, 21 P21, 22 P22, 23 P23, 24 P24, 25 P25

## DB25_Receptacle_MountingHoles
designator *  value DB25_Receptacle_MountingHoles  Reference: J
25-pin female receptacle socket D-SUB connector, Mounting Hole; ki_keywords: female receptacle D-SUB connector; ki_fp_filters: DSUB*Female*; Datasheet: ~; Description_: 25-pin female receptacle socket D-SUB connector, Mounting Hole
pins: 0 PAD, 1, 2, 3, 4, 5, 6, 7, 8, 9, 10, 11, 12, 13, 14 P14, 15 P15, 16 P16, 17 P17, 18 P18, 19 P19, 20 P20, 21 P21, 22 P22, 23 P23, 24 P24, 25 P25

## DC37_Plug
designator *  value DC37_Plug  Reference: J
37-pin male plug pin D-SUB connector; ki_keywords: male plug D-SUB connector; ki_fp_filters: DSUB*Male*; Datasheet: ~; Description_: 37-pin male plug pin D-SUB connector
pins: 1, 2, 3, 4, 5, 6, 7, 8, 9, 10, 11, 12, 13, 14, 15, 16, 17, 18, 19, 20, 21, 22, 23, 24, 25, 26, 27, 28, 29, 30, 31, 32, 33, 34, 35, 36, 37

## DC37_Plug_MountingHoles
designator *  value DC37_Plug_MountingHoles  Reference: J
37-pin male plug pin D-SUB connector, Mounting Hole; ki_keywords: male plug D-SUB connector; ki_fp_filters: DSUB*Male*; Datasheet: ~; Description_: 37-pin male plug pin D-SUB connector, Mounting Hole
pins: 0 PAD, 1, 2, 3, 4, 5, 6, 7, 8, 9, 10, 11, 12, 13, 14, 15, 16, 17, 18, 19, 20, 21, 22, 23, 24, 25, 26, 27, 28, 29, 30, 31, 32, 33, 34, 35, 36, 37

## DC37_Receptacle
designator *  value DC37_Receptacle  Reference: J
37-pin female receptacle socket D-SUB connector; ki_keywords: female receptacle D-SUB connector; ki_fp_filters: DSUB*Female*; Datasheet: ~; Description_: 37-pin female receptacle socket D-SUB connector
pins: 1, 2, 3, 4, 5, 6, 7, 8, 9, 10, 11, 12, 13, 14, 15, 16, 17, 18, 19, 20, 21, 22, 23, 24, 25, 26, 27, 28, 29, 30, 31, 32, 33, 34, 35, 36, 37

## DC37_Receptacle_MountingHoles
designator *  value DC37_Receptacle_MountingHoles  Reference: J
37-pin female receptacle socket D-SUB connector, Mounting Hole; ki_keywords: female receptacle D-SUB connector; ki_fp_filters: DSUB*Female*; Datasheet: ~; Description_: 37-pin female receptacle socket D-SUB connector, Mounting Hole
pins: 0 PAD, 1, 2, 3, 4, 5, 6, 7, 8, 9, 10, 11, 12, 13, 14, 15, 16, 17, 18, 19, 20, 21, 22, 23, 24, 25, 26, 27, 28, 29, 30, 31, 32, 33, 34, 35, 36, 37

## DE9_Plug
designator *  value DE9_Plug  Reference: J
9-pin male plug pin D-SUB connector; ki_keywords: connector male plug D-SUB DB9; ki_fp_filters: DSUB*Male*; Datasheet: ~; Description_: 9-pin male plug pin D-SUB connector
pins: 1, 2, 3, 4, 5, 6, 7, 8, 9

## DE9_Plug_MountingHoles
designator *  value DE9_Plug_MountingHoles  Reference: J
9-pin male plug pin D-SUB connector, Mounting Hole; ki_keywords: connector plug male D-SUB DB9; ki_fp_filters: DSUB*Male*; Datasheet: ~; Description_: 9-pin male plug pin D-SUB connector, Mounting Hole
pins: 0 PAD, 1, 2, 3, 4, 5, 6, 7, 8, 9

## DE9_Receptacle
designator *  value DE9_Receptacle  Reference: J
9-pin female receptacle socket D-SUB connector; ki_keywords: connector receptacle female D-SUB DB9; ki_fp_filters: DSUB*Female*; Datasheet: ~; Description_: 9-pin female receptacle socket D-SUB connector
pins: 1, 2, 3, 4, 5, 6, 7, 8, 9

## DE9_Receptacle_MountingHoles
designator *  value DE9_Receptacle_MountingHoles  Reference: J
9-pin female receptacle socket D-SUB connector, Mounting Hole; ki_keywords: connector receptacle female D-SUB DB9; ki_fp_filters: DSUB*Female*; Datasheet: ~; Description_: 9-pin female receptacle socket D-SUB connector, Mounting Hole
pins: 0 PAD, 1, 2, 3, 4, 5, 6, 7, 8, 9

## DE15_Plug_HighDensity
designator *  value DE15_Plug_HighDensity  Reference: J
15-pin male plug socket D-SUB connector, High density (3 columns), Triple Row, Generic, VGA-connector; ki_keywords: connector plug male VGA D-SUB; ki_fp_filters: DSUB*Male*; Datasheet: ~; Description_: 15-pin male plug socket D-SUB connector, High density (3 columns), Triple Row, Generic, VGA-connector
pins: 1, 2, 3, 4, 5, 6, 7, 8, 9, 10, 11, 12, 13, 14, 15

## DE15_Plug_HighDensity_MountingHoles
designator *  value DE15_Plug_HighDensity_MountingHoles  Reference: J
15-pin male plug socket D-SUB connector, High density (3 columns), Triple Row, Generic, VGA-connector, Mounting Hole; ki_keywords: connector plug male D-SUB VGA; ki_fp_filters: DSUB*Male*; Datasheet: ~; Description_: 15-pin male plug socket D-SUB connector, High density (3 columns), Triple Row, Generic, VGA-connector, Mounting Hole
pins: 0, 1, 2, 3, 4, 5, 6, 7, 8, 9, 10, 11, 12, 13, 14, 15

## DE15_Receptacle_HighDensity
designator *  value DE15_Receptacle_HighDensity  Reference: J
15-pin female receptacle socket D-SUB connector, High density (3 columns), Triple Row, Generic, VGA-connector; ki_keywords: connector  receptacle de15 VGA female D-SUB; ki_fp_filters: DSUB*Female*; Datasheet: ~; Description_: 15-pin female receptacle socket D-SUB connector, High density (3 columns), Triple Row, Generic, VGA-connector
pins: 1, 2, 3, 4, 5, 6, 7, 8, 9, 10, 11, 12, 13, 14, 15

## DE15_Receptacle_HighDensity_MountingHoles
designator *  value DE15_Receptacle_HighDensity_MountingHoles  Reference: J
15-pin female receptacle socket D-SUB connector, High density (3 columns), Triple Row, Generic, VGA-connector, Mounting Hole; ki_keywords: connector receptacle de15 female D-SUB VGA; ki_fp_filters: DSUB*Female*; Datasheet: ~; Description_: 15-pin female receptacle socket D-SUB connector, High density (3 columns), Triple Row, Generic, VGA-connector, Mounting Hole
pins: 0, 1, 2, 3, 4, 5, 6, 7, 8, 9, 10, 11, 12, 13, 14, 15

## DIN41612_01x32_A
designator *  value DIN41612_01x32_A  Reference: J
DIN41612 connector, single row (A), 01x32, script generated (kicad-library-utils/schlib/autogen/connector/); ki_fp_filters: DIN41612*1x*; Datasheet: ~; Description_: DIN41612 connector, single row (A), 01x32, script generated (kicad-library-utils/schlib/autogen/connector/); ki_keywords: connector
pins: a1 Pin_a1, a2 Pin_a2, a3 Pin_a3, a4 Pin_a4, a5 Pin_a5, a6 Pin_a6, a7 Pin_a7, a8 Pin_a8, a9 Pin_a9, a10 Pin_a10, a11 Pin_a11, a12 Pin_a12, a13 Pin_a13, a14 Pin_a14, a15 Pin_a15, a16 Pin_a16, a17 Pin_a17, a18 Pin_a18, a19 Pin_a19, a20 Pin_a20, a21 Pin_a21, a22 Pin_a22, a23 Pin_a23, a24 Pin_a24, a25 Pin_a25, a26 Pin_a26, a27 Pin_a27, a28 Pin_a28, a29 Pin_a29, a30 Pin_a30, a31 Pin_a31, a32 Pin_a32

## DIN41612_02x05_AB_EvenPins
designator *  value DIN41612_02x05_AB_EvenPins  Reference: J
DIN41612 connector, double row (AB) even pins only, 02x05, script generated (kicad-library-utils/schlib/autogen/connector/); ki_fp_filters: DIN41612*2x*; Datasheet: ~; Description_: DIN41612 connector, double row (AB) even pins only, 02x05, script generated (kicad-library-utils/schlib/autogen/connector/); ki_keywords: connector
pins: a2 Pin_a2, a4 Pin_a4, a6 Pin_a6, a8 Pin_a8, a10 Pin_a10, b2 Pin_b2, b4 Pin_b4, b6 Pin_b6, b8 Pin_b8, b10 Pin_b10

## DIN41612_02x05_AC_EvenPins
designator *  value DIN41612_02x05_AC_EvenPins  Reference: J
DIN41612 connector, double row (AC) even pins only, 02x05, script generated (kicad-library-utils/schlib/autogen/connector/); ki_fp_filters: DIN41612*2x*; Datasheet: ~; Description_: DIN41612 connector, double row (AC) even pins only, 02x05, script generated (kicad-library-utils/schlib/autogen/connector/); ki_keywords: connector
pins: a2 Pin_a2, a4 Pin_a4, a6 Pin_a6, a8 Pin_a8, a10 Pin_a10, c2 Pin_c2, c4 Pin_c4, c6 Pin_c6, c8 Pin_c8, c10 Pin_c10

## DIN41612_02x05_AE_EvenPins
designator *  value DIN41612_02x05_AE_EvenPins  Reference: J
DIN41612 connector, double row (AE) even pins only, 02x05, script generated (kicad-library-utils/schlib/autogen/connector/); ki_fp_filters: DIN41612*2x*; Datasheet: ~; Description_: DIN41612 connector, double row (AE) even pins only, 02x05, script generated (kicad-library-utils/schlib/autogen/connector/); ki_keywords: connector
pins: a2 Pin_a2, a4 Pin_a4, a6 Pin_a6, a8 Pin_a8, a10 Pin_a10, e2 Pin_e2, e4 Pin_e4, e6 Pin_e6, e8 Pin_e8, e10 Pin_e10

## DIN41612_02x05_ZB_EvenPins
designator *  value DIN41612_02x05_ZB_EvenPins  Reference: J
DIN41612 connector, double row (ZB) even pins only, 02x05, script generated (kicad-library-utils/schlib/autogen/connector/); ki_fp_filters: DIN41612*2x*; Datasheet: ~; Description_: DIN41612 connector, double row (ZB) even pins only, 02x05, script generated (kicad-library-utils/schlib/autogen/connector/); ki_keywords: connector
pins: b2 Pin_b2, b4 Pin_b4, b6 Pin_b6, b8 Pin_b8, b10 Pin_b10, z2 Pin_z2, z4 Pin_z4, z6 Pin_z6, z8 Pin_z8, z10 Pin_z10

## DIN41612_02x08_AB_EvenPins
designator *  value DIN41612_02x08_AB_EvenPins  Reference: J
DIN41612 connector, double row (AB) even pins only, 02x08, script generated (kicad-library-utils/schlib/autogen/connector/); ki_fp_filters: DIN41612*2x*; Datasheet: ~; Description_: DIN41612 connector, double row (AB) even pins only, 02x08, script generated (kicad-library-utils/schlib/autogen/connector/); ki_keywords: connector
pins: a2 Pin_a2, a4 Pin_a4, a6 Pin_a6, a8 Pin_a8, a10 Pin_a10, a12 Pin_a12, a14 Pin_a14, a16 Pin_a16, b2 Pin_b2, b4 Pin_b4, b6 Pin_b6, b8 Pin_b8, b10 Pin_b10, b12 Pin_b12, b14 Pin_b14, b16 Pin_b16

## DIN41612_02x08_AC_EvenPins
designator *  value DIN41612_02x08_AC_EvenPins  Reference: J
DIN41612 connector, double row (AC) even pins only, 02x08, script generated (kicad-library-utils/schlib/autogen/connector/); ki_fp_filters: DIN41612*2x*; Datasheet: ~; Description_: DIN41612 connector, double row (AC) even pins only, 02x08, script generated (kicad-library-utils/schlib/autogen/connector/); ki_keywords: connector
pins: a2 Pin_a2, a4 Pin_a4, a6 Pin_a6, a8 Pin_a8, a10 Pin_a10, a12 Pin_a12, a14 Pin_a14, a16 Pin_a16, c2 Pin_c2, c4 Pin_c4, c6 Pin_c6, c8 Pin_c8, c10 Pin_c10, c12 Pin_c12, c14 Pin_c14, c16 Pin_c16

## DIN41612_02x08_AE_EvenPins
designator *  value DIN41612_02x08_AE_EvenPins  Reference: J
DIN41612 connector, double row (AE) even pins only, 02x08, script generated (kicad-library-utils/schlib/autogen/connector/); ki_fp_filters: DIN41612*2x*; Datasheet: ~; Description_: DIN41612 connector, double row (AE) even pins only, 02x08, script generated (kicad-library-utils/schlib/autogen/connector/); ki_keywords: connector
pins: a2 Pin_a2, a4 Pin_a4, a6 Pin_a6, a8 Pin_a8, a10 Pin_a10, a12 Pin_a12, a14 Pin_a14, a16 Pin_a16, e2 Pin_e2, e4 Pin_e4, e6 Pin_e6, e8 Pin_e8, e10 Pin_e10, e12 Pin_e12, e14 Pin_e14, e16 Pin_e16

## DIN41612_02x08_ZB_EvenPins
designator *  value DIN41612_02x08_ZB_EvenPins  Reference: J
DIN41612 connector, double row (ZB) even pins only, 02x08, script generated (kicad-library-utils/schlib/autogen/connector/); ki_fp_filters: DIN41612*2x*; Datasheet: ~; Description_: DIN41612 connector, double row (ZB) even pins only, 02x08, script generated (kicad-library-utils/schlib/autogen/connector/); ki_keywords: connector
pins: b2 Pin_b2, b4 Pin_b4, b6 Pin_b6, b8 Pin_b8, b10 Pin_b10, b12 Pin_b12, b14 Pin_b14, b16 Pin_b16, z2 Pin_z2, z4 Pin_z4, z6 Pin_z6, z8 Pin_z8, z10 Pin_z10, z12 Pin_z12, z14 Pin_z14, z16 Pin_z16